# Altium integrated library Connector_Interface.IntLib: 49 symbols
Pins are listed as number, name and electrical type; pins without a type are passive.

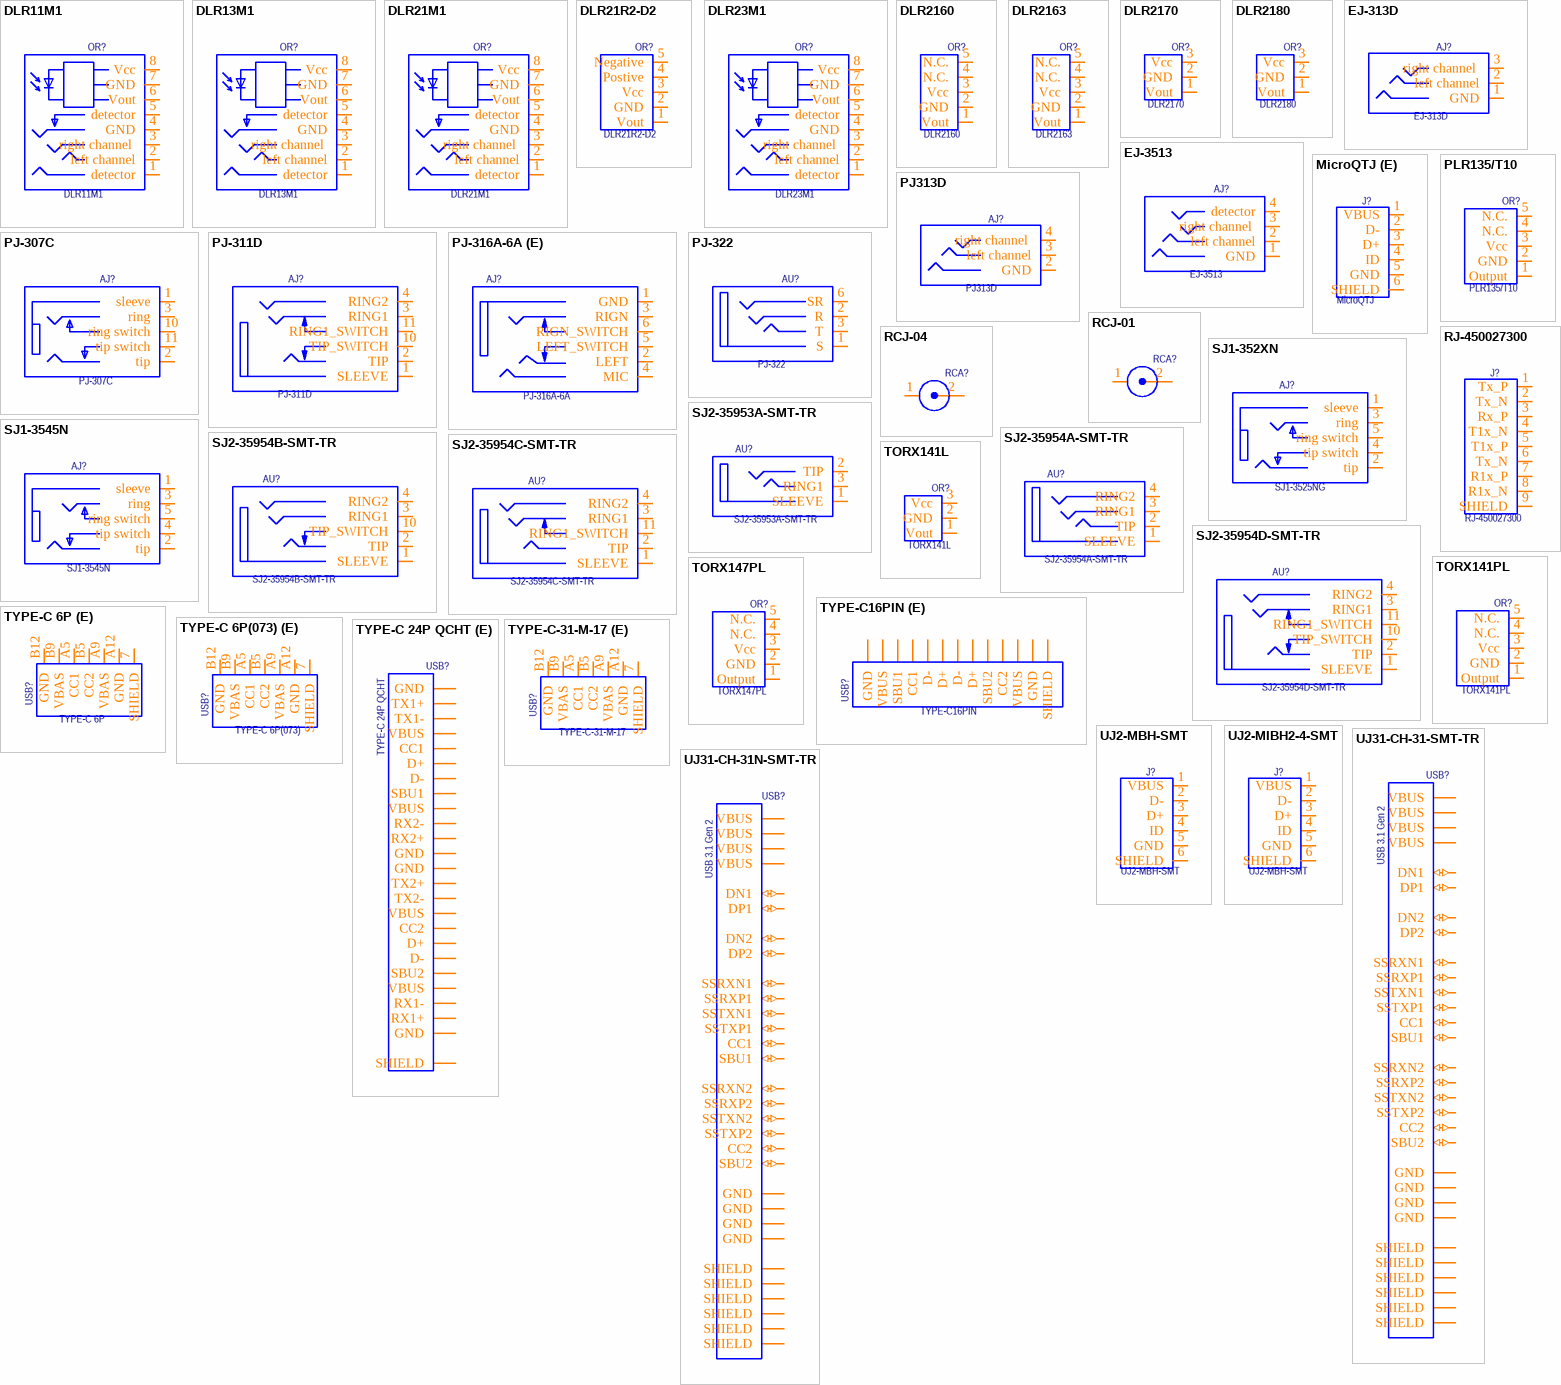
[diagram p0: symbols DLR11M1 to UJ31-CH-31N-SMT-TR]

## DLR11M1
designator OR?  value DLR11M1  (hidden comment: *)
FIBER OPTIC DATA LINK; Manufacturer: Aixin Opto-Electrical Techn; Manufacturer PartNumber: DLR11M1_16Mbps_SPEC_087; Note: Receivers; Temp.Characteristic: -20C to +70C; Voltage: 2.7-5.5 V; HelpURL: http://www.axpof.com/Article/download/aid/10395/fn/DLR11M1_16Mbps_SPEC_087.pdf.html; Publisher: Catcatcat Electronics; Website developer: http://catcatcat.d-lan.dp.ua/; Manufacturer URL: http://www.toslink.cn/Index/index.html; Assembly type: Manual Part
footprint DLR21M1 smd (FIBER OPTIC RECEIVING MODULE)
pins: 1 detector, 2 left channel, 3 right channel , 4 GND, 5 detector, 6 Vout, 7 GND, 8 Vcc

## DLR13M1
designator OR?  value DLR13M1  (hidden comment: *)
FIBER OPTIC DATA LINK; Manufacturer: Aixin Opto-Electrical Techn; Manufacturer PartNumber: DLR13M1_16Mbps_SPEC_084; Note: Receivers; Temp.Characteristic: -20C to +70C; Voltage: 2.7-5.5 V; HelpURL: http://www.axpof.com/Article/download/aid/10370/fn/DLR13M1_16Mbps_SPEC_084.pdf.html; Publisher: Catcatcat Electronics; Website developer: http://catcatcat.d-lan.dp.ua/; Manufacturer URL: http://www.toslink.cn/Index/index.html; Assembly type: Manual Part
footprint DLR23M1 (FIBER OPTIC RECEIVING MODULE)
pins: 1 detector, 2 left channel, 3 right channel , 4 GND, 5 detector, 6 Vout, 7 GND, 8 Vcc

## DLR21M1
designator OR?  value DLR21M1  (hidden comment: *)
FIBER OPTIC DATA LINK; Manufacturer: Aixin Opto-Electrical Techn; Manufacturer PartNumber: DLR21M1_25Mbps_SPEC_170; Note: Receivers; Temp.Characteristic: -20C to +70C; Voltage: 2.7-5.5 V; HelpURL: http://www.axpof.com/Article/download/aid/10396/fn/DLR21M1_25Mbps_SPEC_170.pdf.html; Publisher: Catcatcat Electronics; Website developer: http://catcatcat.d-lan.dp.ua/; Manufacturer URL: http://www.toslink.cn/Index/index.html; Assembly type: Manual Part
footprint DLR21M1 smd (FIBER OPTIC RECEIVING MODULE)
pins: 1 detector, 2 left channel, 3 right channel , 4 GND, 5 detector, 6 Vout, 7 GND, 8 Vcc

## DLR21R2-D2
designator OR?  value DLR21R2-D2  (hidden comment: *)
Fibre Optic Transmitters, Receivers, Transceivers TOSLINK RECEIVER Brd mount 25Mbps; Manufacturer: Aixin Opto-Electrical Techn; Manufacturer PartNumber: DLR21R2-D2_25Mbps_SPEC_103; Temp.Characteristic: -20C to +70C; Voltage: 2.7-5.5 V; HelpURL: http://www.axpof.com/Article/download/aid/10392/fn/DLR21R2-D2_25Mbps_SPEC_103.pdf.html; Note: Receivers; Publisher: Catcatcat Electronics; Website developer: http://catcatcat.d-lan.dp.ua/; Manufacturer URL: http://www.toslink.cn/Index/index.html; Assembly type: Manual Part
footprint DLR21R2-D2 (FIBER OPTIC RECEIVING MODULE)
pins: 1 Vout, 2 GND, 3 Vcc, 4 Postive, 5 Negative

## DLR23M1
designator OR?  value DLR23M1  (hidden comment: *)
FIBER OPTIC DATA LINK; Manufacturer: Aixin Opto-Electrical Techn; Manufacturer PartNumber: DLR23M1_25Mbps_SPEC; Note: Receivers; Temp.Characteristic: -20C to +70C; Voltage: 2.7-5.5 V; HelpURL: http://www.axpof.com/Article/download/aid/10375/fn/DLR23M1_25Mbps_SPEC.pdf.html; Publisher: Catcatcat Electronics; Website developer: http://catcatcat.d-lan.dp.ua/; Manufacturer URL: http://www.toslink.cn/Index/index.html; Assembly type: Manual Part
footprint DLR23M1 (FIBER OPTIC RECEIVING MODULE)
pins: 1 detector, 2 left channel, 3 right channel , 4 GND, 5 detector, 6 Vout, 7 GND, 8 Vcc

## DLR2160
designator OR?  value DLR2160  (hidden comment: *)
Fibre Optic Transmitters, Receivers, Transceivers TOSLINK RECEIVER Brd mount 25Mbps; Manufacturer: Aixin Opto-Electrical Techn; Manufacturer PartNumber: DLR2160_25Mbps_SPEC_156; Temp.Characteristic: -20C to +70C; Voltage: 2.7-5.5 V; HelpURL: http://www.axpof.com/Article/download/aid/10330/fn/DLR2160_25Mbps_SPEC_156.pdf.html; Note: Receivers; Publisher: Catcatcat Electronics; Website developer: http://catcatcat.d-lan.dp.ua/; Manufacturer URL: http://www.toslink.cn/Index/index.html; Assembly type: Manual Part
footprint DLR2160 (FIBER OPTIC RECEIVING MODULE)
pins: 1 Vout, 2 GND, 3 Vcc, 4 N.C., 5 N.C.

## DLR2163
designator OR?  value DLR2163  (hidden comment: *)
Fibre Optic Transmitters, Receivers, Transceivers TOSLINK RECEIVER Brd mount 25Mbps; Manufacturer: Aixin Opto-Electrical Techn; Manufacturer PartNumber: DLR2163_25Mbps_SPEC_256; Temp.Characteristic: -20C to +70C; Voltage: 2.7-5.5 V; HelpURL: http://www.axpof.com/Article/download/aid/10323/fn/DLR2163_25Mbps_SPEC_256.pdf.html; Note: Receivers; Publisher: Catcatcat Electronics; Website developer: http://catcatcat.d-lan.dp.ua/; Manufacturer URL: http://www.toslink.cn/Index/index.html; Assembly type: Manual Part
footprint DLR2163 (FIBER OPTIC RECEIVING MODULE)
pins: 1 Vout, 2 GND, 3 Vcc, 4 N.C., 5 N.C.

## DLR2170
designator OR?  value DLR2170  (hidden comment: *)
Fibre Optic Transmitters, Receivers, Transceivers TOSLINK RECEIVER Brd mount 25Mbps; Manufacturer: Aixin Opto-Electrical Techn; Manufacturer PartNumber: DLR2170_25Mbps_SPEC_160; Temp.Characteristic: -20C to +70C; Voltage: 2.7-5.5 V; HelpURL: http://www.axpof.com/Article/download/aid/10324/fn/DLR2170_25Mbps_SPEC_160.pdf.html; Note: Receivers; Publisher: Catcatcat Electronics; Website developer: http://catcatcat.d-lan.dp.ua/; Manufacturer URL: http://www.toslink.cn/Index/index.html; Assembly type: Manual Part
footprint DLR2170 (FIBER OPTIC RECEIVING MODULE)
pins: 1 Vout, 2 GND, 3 Vcc

## DLR2180
designator OR?  value DLR2180  (hidden comment: *)
Fibre Optic Transmitters, Receivers, Transceivers TOSLINK RECEIVER Brd mount 25Mbps; Manufacturer: Aixin Opto-Electrical Techn; Manufacturer PartNumber: DLR2180_25Mbps_SPEC_098; Temp.Characteristic: -20C to +70C; Voltage: 2.7-5.5 V; HelpURL: http://www.axpof.com/Article/download/aid/10325/fn/DLR2180_25Mbps_SPEC_098.pdf.html; Note: Receivers; Publisher: Catcatcat Electronics; Website developer: http://catcatcat.d-lan.dp.ua/; Manufacturer URL: http://www.toslink.cn/Index/index.html; Assembly type: Manual Part
footprint DLR2180 (FIBER OPTIC RECEIVING MODULE)
pins: 1 Vout, 2 GND, 3 Vcc

## EJ-313D
designator AJ?
AUDIO JACKS 3.5 MM; Manufacturer PartNumber: EJ-3513; Note: Connector Interface; Temp.Characteristic: -20C to +70C; Voltage: 2.7-5.5 V; Publisher: Catcatcat Electronics; Website developer: http://catcatcat.d-lan.dp.ua/; Assembly type: Manual Part; Value: EJ-313D
footprint EJ-313D
pins: 1 GND, 2 left channel, 3 right channel 

## EJ-3513
designator AJ?  value EJ-3513  (hidden comment: *)
AUDIO JACKS 3.5 MM; Note: Connector Interface; Temp.Characteristic: -20C to +70C; Voltage: 2.7-5.5 V; Publisher: Catcatcat Electronics; Manufacturer PartNumber: EJ-3513; Website developer: http://catcatcat.d-lan.dp.ua/; Assembly type: Manual Part
footprint EJ-3513
pins: 1 GND, 2 left channel, 3 right channel , 4 detector

## MicroQTJ (E)
designator J?, comment MicroQTJ
SMD USB Connectors RoHS; Manufacturer: we-online; Manufacturer PartNumber: SHOU HAN; Note: Connector Interface; Temp.Characteristic: -20C to +70C; HelpURL: https://datasheet.lcsc.com/szlcsc/1912111437_SHOU-HAN-MicroQTJ_C404968.pdf; Publisher: Catcatcat Electronics; Website developer: http://catcatcat.d-lan.dp.ua/; Detailed Description: SMD USB Connectors RoHS; Assembly type: Extended Part; Package / Case: SMD; PartNumber LCSC: C404968; Pricing LCSC: 0.0267; Value: MicroQTJ
footprint USB micro B 3 (USB micro B)
pins: 1 VBUS, 2 D-, 3 D+, 4 ID, 5 GND, 6 SHIELD

## PJ313D
designator AJ?
AUDIO JACKS 3.5 MM; Manufacturer: BOOMELE(Boom Precision Elec); Note: Audio Jack Connector; Temp.Characteristic: -20C to +70C; Voltage: 2.7-5.5 V; Detailed Description: 3.5mm 插件式耳机座 5 Female Horizontal Through Hole Audio & Video Connectors RoHS; HelpURL: https://datasheet.lcsc.com/szlcsc/1810271709_BOOMELE-Boom-Precision-Elec-C18167_C18167.pdf; Publisher: Catcatcat Electronics; Manufacturer PartNumber: PJ313D; Website developer: http://catcatcat.d-lan.dp.ua/; Assembly type: Manual Part; PartNumber LCSC: C18167; Pricing LCSC: 0.050716; Value: PJ313D
footprint PJ313D
pins: 2 GND, 3 left channel, 4 right channel 

## PJ-307C
designator AJ?
3.5 MM AUDIO JACKS стерео; Manufacturer: BOOMELE(Boom Precision Elec); Note: Audio & Video Connectors; Temp.Characteristic: -20C to +70C; Voltage: 2.7-5.5 V; HelpURL: https://www.cuidevices.com/product/resource/sj1-352xn.pdf; Publisher: Catcatcat Electronics; Manufacturer PartNumber: PJ-307C; Website developer: http://catcatcat.d-lan.dp.ua/; Assembly type: Manual Part; Dealer Аlternative: https://voron.ua/catalog/018788--gnezdo_pj3f07pj-307_35mm_stereo_otkl; PartNumber LCSC: C16684; Pricing LCSC: 0.028176; Value: PJ-307C
footprint SJ1-352XN (3.5 MM AUDIO JACKS)
pins: 1 sleeve, 2 tip, 3 ring, 10 ring switch, 11 tip switch

## PJ-311D
designator AJ?
AUDIO JACKS 3.5 MM; Note: Connector Interface; Temp.Characteristic: -20C to +70C; HelpURL: https://voron.ua/catalog/037846; Publisher: Catcatcat Electronics; Manufacturer PartNumber: PJ-311D; Website developer: http://catcatcat.d-lan.dp.ua/; Assembly type: Manual Part; Value: PJ-311D
footprint PJ-311D
footprint PJ-311D - no3D
pins: 1 SLEEVE, 2 TIP, 3 RING1, 4 RING2, 10 TIP_SWITCH, 11 RING1_SWITCH

## PJ-316A-6A (E)
designator AJ?, comment PJ-316A-6A
3.5mm SMD Headphone Holder 6 Female Horizontal SMD Audio & Video Connectors RoHS; Manufacturer: Korean Hroparts Elec; Note: Connector Interface; Temp.Characteristic: -20C to +70C; Sales Unit: For qty≤5,charges a fixed fee $0.8655; HelpURL: https://datasheet.lcsc.com/szlcsc/1810121710_Korean-Hroparts-Elec-PJ-316A-6A_C128987.pdf; Publisher: Catcatcat Electronics; Manufacturer PartNumber: PJ-316A-6A; Website developer: http://catcatcat.d-lan.dp.ua/; Detailed Description: 3.5mm SMD Headphone Holder 6 Female Horizontal SMD Audio & Video Connectors RoHS; Assembly type: Extended Part; Package / Case: SMD; PartNumber LCSC: C128987; Pricing LCSC: 0.1731; Value: PJ-316A-6A
footprint PJ-316A-6A
footprint PJ-316A-6A - no3D
pins: 1 GND, 2 LEFT, 3 RIGN, 4 MIC, 5 LEFT_SWITCH, 6 RIGN_SWITCH

## PJ-322
designator AU?
AUDIO JACKS 3.5 MM; Manufacturer PartNumber: EJ-3513; Note: Connector Interface; Temp.Characteristic: -20C to +70C; Voltage: 2.7-5.5 V; HelpURL: https://datasheet.octopart.com/FC68125-Cliff-datasheet-14704145.pdf; Publisher: Catcatcat Electronics; Website developer: http://catcatcat.d-lan.dp.ua/; Assembly type: Manual Part; Value: PJ-322
footprint PJ-322
pins: 1 S, 2 R, 3 T, 6 SR

## PLR135/T10
designator OR?
RECEIVER FIBER OPT IR PHOTOLINK; Manufacturer: Everlight Electronics Co Ltd; Note: Fiber Optics - Receivers; Temp.Characteristic: -20C to +70C; Voltage: 2.4V ~ 5.5V; Detailed Description: Fiber Optic Receiver General Data Transfer 16Mbps -27dBm 2.4V ~ 5.5V 12mA; Data Rate: 16Mbps; HelpURL: http://www.everlight.com/file/ProductFile/PLR135-T10.pdf; Dealer: https://ru.aliexpress.com/item/PLR135-T10-PLR135-10/32923100244.html?spm=a2g0s.9042311.0.0.3da233ed3KjIXT; Publisher: Catcatcat Electronics; Manufacturer PartNumber: PLR135/T10; Website developer: http://catcatcat.d-lan.dp.ua/; Manufacturer URL: http://www.everlight.com/; Assembly type: Manual Part; Value: PLR135/T10
footprint TORX147PL (FIBER OPTIC RECEIVING MODULE)
pins: 1 Output, 2 GND, 3 Vcc, 4 N.C., 5 N.C.

## RCJ-01
designator RCA?  (value not drawn)
RCA Jack Connector; Manufacturer: cui; Manufacturer PartNumber: RCJ-01; Note: Connector Interface; Temp.Characteristic: -40C to +85C; Value: {Value}; HelpURL: https://www.cui.com/product/resource/pdf/rcj-01x.pdf; Publisher: Catcatcat Electronics; Website developer: http://catcatcat.d-lan.dp.ua/; Manufacturer URL: https://www.cui.com/; Assembly type: Manual Part
footprint RCJ-011 black (RCA Jack Connector)
footprint RCJ-012 red (RCA Jack Connector)
footprint RCJ-013 while (RCA Jack Connector)
footprint RCJ-014 yellow (RCA Jack Connector)
footprint RCJ-015 blue (RCA Jack Connector)
footprint RCJ-016 green (RCA Jack Connector)
footprint RCJ-017 orange (RCA Jack Connector)
pins: 1, 2

## RCJ-04
designator RCA?  (value not drawn)
RCA Jack Connector; Manufacturer: cui; Manufacturer PartNumber: RCJ-04; Note: Connector Interface; Temp.Characteristic: -40C to +85C; Value: {Value}; HelpURL: https://www.cui.com/product/resource/pdf/rcj-04x.pdf; Publisher: Catcatcat Electronics; Website developer: http://catcatcat.d-lan.dp.ua/; Manufacturer URL: https://www.cui.com/; Assembly type: Manual Part
footprint RCJ-041 black (RCA Jack Connector)
footprint RCJ-042 red (RCA Jack Connector)
footprint RCJ-043 while (RCA Jack Connector)
footprint RCJ-044 yellow (RCA Jack Connector)
footprint RCJ-045 blue (RCA Jack Connector)
footprint RCJ-046 green (RCA Jack Connector)
footprint RCJ-047 orange (RCA Jack Connector)
pins: 1, 2

## RJ-450027300
designator J?
Разъем RJ-45, без светодиодов, экранированный; Manufacturer: ATOM; Manufacturer PartNumber: ATOM-A01152; Temp.Characteristic: -20C to +70C; Detailed Description: Разъем RJ-45 монтаж на плату, без светодиодов, экранированный; HelpURL: http://microchip.ua/atom/RJ-450027300.pdf; Note: RJ-45; Publisher: Catcatcat Electronics; Website developer: http://catcatcat.d-lan.dp.ua/; Assembly type: Manual Part; Dealer Аlternative: http://www.microchip.ua/; Value: RJ-450027300
footprint RJ-450027300
pins: 1 Tx_P, 2 Tx_N, 3 Rx_P, 4 T1x_N, 5 T1x_P, 6 Tx_N, 7 R1x_P, 8 R1x_N, 9 SHIELD

## SJ1-352XN
designator AJ?  value SJ1-3525NG  (hidden comment: *)
AUDIO JACKS 3.5 MM; Note: Connector Interface; Temp.Characteristic: -20C to +70C; Voltage: 2.7-5.5 V; HelpURL: https://www.cuidevices.com/product/resource/sj1-352xn.pdf; Publisher: Catcatcat Electronics; Website developer: http://catcatcat.d-lan.dp.ua/; Assembly type: Manual Part
footprint SJ1-352XNG (3.5 MM AUDIO JACKS)
pins: 1 sleeve, 2 tip, 3 ring, 4 tip switch, 5 ring switch

## SJ1-3545N
designator AJ?
AUDIO JACKS 3.5 MM; Note: Connector Interface; Temp.Characteristic: -20C to +70C; Voltage: 2.7-5.5 V; HelpURL: https://www.cuidevices.com/product/resource/sj1-354xn-series.pdf; Publisher: Catcatcat Electronics; Website developer: http://catcatcat.d-lan.dp.ua/; Assembly type: Manual Part; Value: SJ1-3545N
footprint SJ1-3545N
pins: 1 sleeve, 2 tip, 3 ring, 4 tip switch, 5 ring switch

## SJ2-35953A-SMT-TR
designator AU?
AUDIO JACKS 3.5 MM; Note: Connector Interface; Temp.Characteristic: -20C to +70C; Voltage: 2.7-5.5 V; HelpURL: https://www.cuidevices.com/product/resource/sj2-3595x-smt.pdf; Publisher: Catcatcat Electronics; Manufacturer PartNumber: SJ2-35953A-SMT-TR; Website developer: http://catcatcat.d-lan.dp.ua/; Assembly type: Manual Part; Value: SJ2-35953A-SMT-TR
footprint CUI_SJ2-35953A-SMT-TR
pins: 1 SLEEVE, 2 TIP, 3 RING1

## SJ2-35954A-SMT-TR
designator AU?
AUDIO JACKS 3.5 MM; Note: Connector Interface; Temp.Characteristic: -20C to +70C; Voltage: 2.7-5.5 V; HelpURL: https://www.cuidevices.com/product/resource/sj2-3595x-smt.pdf; Publisher: Catcatcat Electronics; Manufacturer PartNumber: SJ2-35954A-SMT-TR; Website developer: http://catcatcat.d-lan.dp.ua/; Assembly type: Manual Part; Value: SJ2-35954A-SMT-TR
footprint CUI_SJ2-35954A-SMT-TR
pins: 1 SLEEVE, 2 TIP, 3 RING1, 4 RING2

## SJ2-35954B-SMT-TR
designator AU?
AUDIO JACKS 3.5 MM; Note: Connector Interface; Temp.Characteristic: -20C to +70C; Voltage: 2.7-5.5 V; HelpURL: https://www.cuidevices.com/product/resource/sj2-3595x-smt.pdf; Publisher: Catcatcat Electronics; Manufacturer PartNumber: SJ2-35954B-SMT-TR; Website developer: http://catcatcat.d-lan.dp.ua/; Assembly type: Manual Part; Value: SJ2-35954B-SMT-TR
footprint CUI_SJ2-35954B-SMT-TR
pins: 1 SLEEVE, 2 TIP, 3 RING1, 4 RING2, 10 TIP_SWITCH

## SJ2-35954C-SMT-TR
designator AU?
AUDIO JACKS 3.5 MM; Note: Connector Interface; Temp.Characteristic: -20C to +70C; Voltage: 2.7-5.5 V; HelpURL: https://www.cuidevices.com/product/resource/sj2-3595x-smt.pdf; Publisher: Catcatcat Electronics; Manufacturer PartNumber: SJ2-35954C-SMT-TR; Website developer: http://catcatcat.d-lan.dp.ua/; Assembly type: Manual Part; Value: SJ2-35954C-SMT-TR
footprint CUI_SJ2-35954C-SMT-TR
pins: 1 SLEEVE, 2 TIP, 3 RING1, 4 RING2, 11 RING1_SWITCH

## SJ2-35954D-SMT-TR
designator AU?
AUDIO JACKS 3.5 MM; Note: Connector Interface; Temp.Characteristic: -20C to +70C; Voltage: 2.7-5.5 V; HelpURL: https://www.cuidevices.com/product/resource/sj2-3595x-smt.pdf; Publisher: Catcatcat Electronics; Manufacturer PartNumber: SJ2-35954D-SMT-TR; Website developer: http://catcatcat.d-lan.dp.ua/; Assembly type: Manual Part; Value: SJ2-35954D-SMT-TR
footprint CUI_SJ2-35954D-SMT-TR
pins: 1 SLEEVE, 2 TIP, 3 RING1, 4 RING2, 10 TIP_SWITCH, 11 RING1_SWITCH

## TORX141L
designator OR?  value TORX141L  (hidden comment: *)
FIBER OPTIC RECEIVING MODULE; Note: Receivers; Temp.Characteristic: -20C to +70C; Voltage: 2.7-5.5 V; Publisher: Catcatcat Electronics; Website developer: http://catcatcat.d-lan.dp.ua/; Assembly type: Manual Part
footprint DLR2180 (FIBER OPTIC RECEIVING MODULE)
pins: 1 Vout, 2 GND, 3 Vcc

## TORX141PL
designator OR?  value TORX141PL  (hidden comment: *)
Fibre Optic Transmitters, Receivers, Transceivers TOSLINK RECEIVER Brd mount 25Mbps; Manufacturer: Toshiba; Temp.Characteristic: -20C to +70C; Voltage: 3 V; HelpURL: https://eu.mouser.com/datasheet/2/408/torx147pl(f,t)_en_datasheet_061228-1209275.pdf; Note: Receivers; Publisher: Catcatcat Electronics; Manufacturer PartNumber: TORX141PL; Website developer: http://catcatcat.d-lan.dp.ua/; Assembly type: Manual Part
footprint TORX147PL (FIBER OPTIC RECEIVING MODULE)
pins: 1 Output, 2 GND, 3 Vcc, 4 N.C., 5 N.C.

## TORX147PL
designator OR?  value TORX147PL  (hidden comment: *)
Fibre Optic Transmitters, Receivers, Transceivers TOSLINK RECEIVER Brd mount 25Mbps; Manufacturer: Toshiba; Manufacturer PartNumber: TORX147PL(25M,F,T); Temp.Characteristic: -20C to +70C; Voltage: 3 V; HelpURL: https://eu.mouser.com/datasheet/2/408/torx147pl(f,t)_en_datasheet_061228-1209275.pdf; Note: Receivers; Publisher: Catcatcat Electronics; Website developer: http://catcatcat.d-lan.dp.ua/; Assembly type: Manual Part
footprint TORX147PL (FIBER OPTIC RECEIVING MODULE)
pins: 1 Output, 2 GND, 3 Vcc, 4 N.C., 5 N.C.

## TYPE-C16PIN (E)
designator USB?, comment TYPE-C16PIN
Type C DIP+SMD USB Connectors RoHS; Manufacturer: SHOU HAN; Temp.Characteristic: -20C to +70C; Sales Unit: For qty≤5,charges a fixed fee $0.5630; HelpURL: https://datasheet.lcsc.com/szlcsc/1912111437_SHOU-HAN-TYPE-C16PIN_C393939.pdf; Note: DIP+SMD USB Connectors RoHS; Publisher: Catcatcat Electronics; Manufacturer PartNumber: TYPE-C16PIN; Website developer: http://catcatcat.d-lan.dp.ua/; Manufacturer URL: https://www.cuidevices.com/catalog/interconnect/connectors/usb-connectors; Detailed Description: SMD USB Connectors RoHS; Assembly type: Extended Part; Package / Case: SMD; PartNumber LCSC: C393939; Pricing LCSC: 0.1126; Value: TYPE-C16PIN
footprint TYPE-C16PIN
pins: A1B12 GND (power), A4B9 VBUS (power), A5 CC1, A6 D+, A7 D-, A8 SBU1, B1A12 GND, B4A9 VBUS, B5 CC2, B6 D+, B7 D-, B8 SBU2, SH SHIELD (power)

## TYPE-C 6P (E)
designator USB?, comment TYPE-C 6P
5A 20V USB Connectors RoHS; Manufacturer: SHOU HAN; Temp.Characteristic: -20C to +70C; Voltage: 20V 5A; Detailed Description: 5 A USB Connectors RoHS; HelpURL: https://datasheet.lcsc.com/szlcsc/2012031006_SHOU-HAN-TYPE-C-6P_C456012.pdf; Note: USB Connectors RoHS; Publisher: Catcatcat Electronics; Manufacturer PartNumber: TYPE-C 6P; Website developer: http://catcatcat.d-lan.dp.ua/; Assembly type: Extended Part; Package / Case: USB - Type C; PartNumber LCSC: C456012; Pricing LCSC: 0.0605; Value: TYPE-C 6P
footprint TYPE-C 6P(073)
pins: 7 SHIELD, A5 CC1, A9 VBAS, A12 GND, B5 CC2, B9 VBAS, B12 GND

## TYPE-C 6P(073) (E)
designator USB?, comment TYPE-C 6P(073)
5A 5V USB Connectors RoHS; Manufacturer: SHOU HAN; Temp.Characteristic: -20C to +70C; Voltage: 5V 5A; Detailed Description: 5 A USB Connectors RoHS; HelpURL: https://datasheet.lcsc.com/szlcsc/2006181823_SHOU-HAN-TYPE-C-6P-073_C668623.pdf; Note: USB Connectors RoHS; Publisher: Catcatcat Electronics; Manufacturer PartNumber: TYPE-C 6P(073); Website developer: http://catcatcat.d-lan.dp.ua/; Assembly type: Extended Part; Package / Case: USB - Type C; PartNumber LCSC: C668623; Pricing LCSC: 0.0581; Value: TYPE-C 6P(073)
footprint TYPE-C 6P(073)
pins: 7 SHIELD, A5 CC1, A9 VBAS, A12 GND, B5 CC2, B9 VBAS, B12 GND

## TYPE-C 24P QCHT (E)
designator USB?, comment TYPE-C 24P QCHT
Type C DIP+SMD USB Connectors RoHS; Manufacturer: SHOU HAN; Temp.Characteristic: -20C to +70C; Sales Unit: For qty≤2,charges a fixed fee $0.9880; HelpURL: https://datasheet.lcsc.com/szlcsc/1912111437_SHOU-HAN-TYPE-C-24P-QCHT_C456013.pdf; Note: DIP+SMD USB Connectors RoHS; Publisher: Catcatcat Electronics; Manufacturer PartNumber: TYPE-C 24P QCHT; Website developer: http://catcatcat.d-lan.dp.ua/; Manufacturer URL: https://www.cuidevices.com/catalog/interconnect/connectors/usb-connectors; Detailed Description: DIP+SMD USB Connectors RoHS; Assembly type: Extended Part; Package / Case: DIP+SMD; PartNumber LCSC: C456013; Pricing LCSC: 0.4940; Value: TYPE-C 24P QCHT
footprint TYPE-C 24P QCHT
pins: A1 GND (power), A2 TX1+ (power), A3 TX1- (power), A4 VBUS (power), A5 CC1, A6 D+, A7 D-, A8 SBU1, A9 VBUS, A10 RX2-, A11 RX2+, A12 GND, B1 GND, B2 TX2+, B3 TX2-, B4 VBUS, B5 CC2, B6 D+, B7 D-, B8 SBU2, B9 VBUS (power), B10 RX1- (power), B11 RX1+ (power), B12 GND (power), SH SHIELD (power)

## TYPE-C-31-M-17 (E)
designator USB?, comment TYPE-C-31-M-17
USB Connectors RoHS; Manufacturer: Korean Hroparts Elec; Temp.Characteristic: -20C to +70C; Voltage: 3 V; HelpURL: https://datasheet.lcsc.com/szlcsc/1811101526_Korean-Hroparts-Elec-TYPE-C-31-M-17_C283540.pdf; Note: USB Connectors RoHS; Publisher: Catcatcat Electronics; Manufacturer PartNumber: TYPE-C-31-M-17; Website developer: http://catcatcat.d-lan.dp.ua/; Detailed Description: USB Connectors RoHS; Assembly type: Manual Part; Package / Case: USB - Type C; PartNumber LCSC: C283540; Pricing LCSC: 0.2045; Value: TYPE-C-31-M-17
footprint TYPE-C-31-M-17
pins: 7 SHIELD, A5 CC1, A9 VBAS, A12 GND, B5 CC2, B9 VBAS, B12 GND

## UJ2-MBH-SMT
designator J?
USB mini B; Note: Receivers; Temp.Characteristic: -20C to +70C; Voltage: 3 V; Publisher: Catcatcat Electronics; Manufacturer PartNumber: UJ2-MBH-SMT; Website developer: http://catcatcat.d-lan.dp.ua/; Assembly type: Manual Part; Value: UJ2-MBH-SMT
footprint USB mini B
footprint UJ2-MBH-SMT (USB mini B)
pins: 1 VBUS, 2 D-, 3 D+, 4 ID, 5 GND, 6 SHIELD

## UJ2-MIBH2-4-SMT
designator J?, comment UJ2-MBH-SMT
USB mini B; Note: Receivers; Temp.Characteristic: -20C to +70C; Voltage: 3 V; Publisher: Catcatcat Electronics; Manufacturer PartNumber: UJ2-MBH-SMT; Website developer: http://catcatcat.d-lan.dp.ua/; Assembly type: Manual Part; Value: UJ2-MBH-SMT
footprint UJ2-MIBH2-4-SMT
pins: 1 VBUS, 2 D-, 3 D+, 4 ID, 5 GND, 6 SHIELD

## UJ31-CH-31-SMT-TR
designator USB?  value USB 3.1 Gen 2  (hidden comment: UJ31-CH-31-SMT-TR)
Type C; Manufacturer: we-online; Temp.Characteristic: -20C to +70C; HelpURL: https://www.cuidevices.com/product/resource/pdf/uj31-ch-smt.pdf; Note: USB 3.1 Gen 2; Publisher: Catcatcat Electronics; Manufacturer PartNumber: UJ31-CH-31-SMT-TR; Website developer: http://catcatcat.d-lan.dp.ua/; Manufacturer URL: https://www.cuidevices.com/catalog/interconnect/connectors/usb-connectors; Detailed Description: Type C; Assembly type: Manual Part; Package / Case: Surface Mount
footprint UJ31-CH-31-SMT-TR
pins: A1 GND (power), A2 SSTXP1 (io), A3 SSTXN1 (io), A4 VBUS (power), A5 CC1 (io), A6 DP1 (io), A7 DN1 (io), A8 SBU1 (io), A9 VBUS (power), A10 SSRXN2 (io), A11 SSRXP2 (io), A12 GND (power), B1 GND (power), B2 SSTXP2 (io), B3 SSTXN2 (io), B4 VBUS (power), B5 CC2 (io), B6 DP2 (io), B7 DN2 (io), B8 SBU2 (io), B9 VBUS (power), B10 SSRXN1 (io), B11 SSRXP1 (io), B12 GND (power), SH1 SHIELD (power), SH2 SHIELD (power), SH3 SHIELD (power), SH4 SHIELD (power), SH5 SHIELD (power), SH6 SHIELD (power)

## UJ31-CH-31N-SMT-TR
designator USB?  value USB 3.1 Gen 2  (hidden comment: UJ31-CH-31N-SMT-TR)
Type C; Manufacturer: we-online; Manufacturer PartNumber: UJ31-CH-31-SMT-TR; Temp.Characteristic: -20C to +70C; HelpURL: https://www.cuidevices.com/product/resource/pdf/uj31-ch-smt.pdf; Note: USB 3.1 Gen 2; Publisher: Catcatcat Electronics; Website developer: http://catcatcat.d-lan.dp.ua/; Manufacturer URL: https://www.cuidevices.com/catalog/interconnect/connectors/usb-connectors; Detailed Description: Type C; Assembly type: Manual Part; Package / Case: Surface Mount
footprint UJ31-CH-31N-SMT-TR
pins: A1 GND (power), A2 SSTXP1 (io), A3 SSTXN1 (io), A4 VBUS (power), A5 CC1 (io), A6 DP1 (io), A7 DN1 (io), A8 SBU1 (io), A9 VBUS (power), A10 SSRXN2 (io), A11 SSRXP2 (io), A12 GND (power), B1 GND (power), B2 SSTXP2 (io), B3 SSTXN2 (io), B4 VBUS (power), B5 CC2 (io), B6 DP2 (io), B7 DN2 (io), B8 SBU2 (io), B9 VBUS (power), B10 SSRXN1 (io), B11 SSRXP1 (io), B12 GND (power), SH1 SHIELD (power), SH2 SHIELD (power), SH3 SHIELD (power), SH4 SHIELD (power), SH5 SHIELD (power), SH6 SHIELD (power)

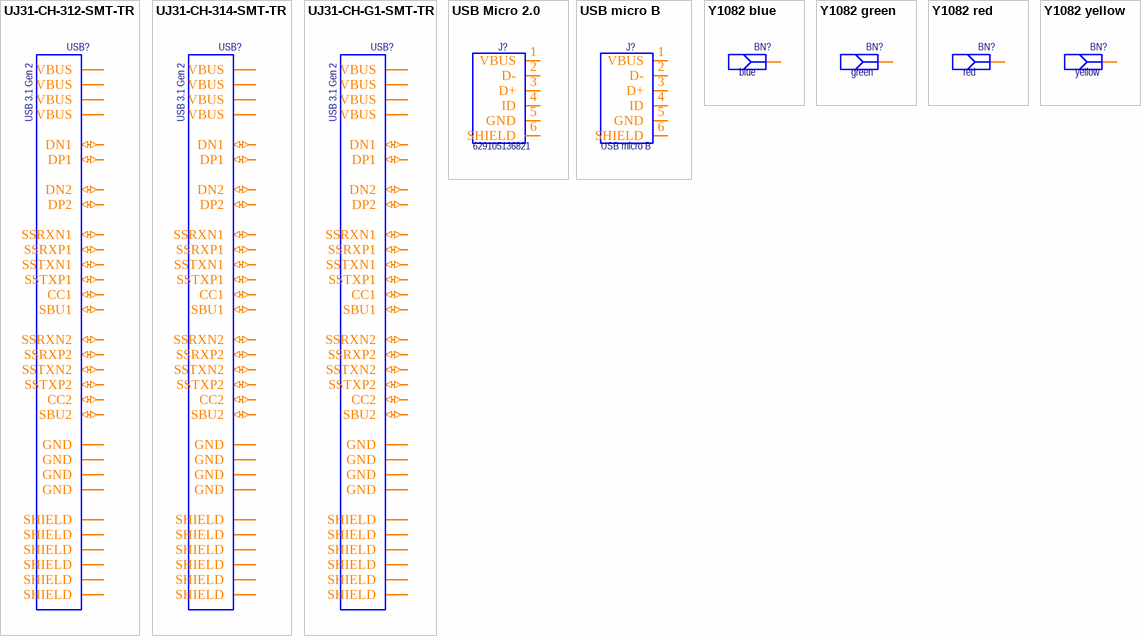
[diagram p1: symbols UJ31-CH-312-SMT-TR to Y1082 yellow]

## UJ31-CH-312-SMT-TR
designator USB?  value USB 3.1 Gen 2  (hidden comment: UJ31-CH-312-SMT-TR)
Type C; Manufacturer: we-online; Manufacturer PartNumber: UJ31-CH-31-SMT-TR; Temp.Characteristic: -20C to +70C; HelpURL: https://www.cuidevices.com/product/resource/pdf/uj31-ch-smt.pdf; Note: USB 3.1 Gen 2; Publisher: Catcatcat Electronics; Website developer: http://catcatcat.d-lan.dp.ua/; Manufacturer URL: https://www.cuidevices.com/catalog/interconnect/connectors/usb-connectors; Detailed Description: Type C; Assembly type: Manual Part; Package / Case: Surface Mount
footprint UJ31-CH-312-SMT-TR
pins: A1 GND (power), A2 SSTXP1 (io), A3 SSTXN1 (io), A4 VBUS (power), A5 CC1 (io), A6 DP1 (io), A7 DN1 (io), A8 SBU1 (io), A9 VBUS (power), A10 SSRXN2 (io), A11 SSRXP2 (io), A12 GND (power), B1 GND (power), B2 SSTXP2 (io), B3 SSTXN2 (io), B4 VBUS (power), B5 CC2 (io), B6 DP2 (io), B7 DN2 (io), B8 SBU2 (io), B9 VBUS (power), B10 SSRXN1 (io), B11 SSRXP1 (io), B12 GND (power), SH1 SHIELD (power), SH2 SHIELD (power), SH3 SHIELD (power), SH4 SHIELD (power), SH5 SHIELD (power), SH6 SHIELD (power)

## UJ31-CH-314-SMT-TR
designator USB?  value USB 3.1 Gen 2  (hidden comment: UJ31-CH-314-SMT-TR)
Type C; Manufacturer: we-online; Manufacturer PartNumber: UJ31-CH-31-SMT-TR; Temp.Characteristic: -20C to +70C; HelpURL: https://www.cuidevices.com/product/resource/pdf/uj31-ch-smt.pdf; Note: USB 3.1 Gen 2; Publisher: Catcatcat Electronics; Website developer: http://catcatcat.d-lan.dp.ua/; Manufacturer URL: https://www.cuidevices.com/catalog/interconnect/connectors/usb-connectors; Detailed Description: Type C; Assembly type: Manual Part; Package / Case: Surface Mount
footprint UJ31-CH-314-SMT-TR
pins: A1 GND (power), A2 SSTXP1 (io), A3 SSTXN1 (io), A4 VBUS (power), A5 CC1 (io), A6 DP1 (io), A7 DN1 (io), A8 SBU1 (io), A9 VBUS (power), A10 SSRXN2 (io), A11 SSRXP2 (io), A12 GND (power), B1 GND (power), B2 SSTXP2 (io), B3 SSTXN2 (io), B4 VBUS (power), B5 CC2 (io), B6 DP2 (io), B7 DN2 (io), B8 SBU2 (io), B9 VBUS (power), B10 SSRXN1 (io), B11 SSRXP1 (io), B12 GND (power), SH1 SHIELD (power), SH2 SHIELD (power), SH3 SHIELD (power), SH4 SHIELD (power), SH5 SHIELD (power), SH6 SHIELD (power)

## UJ31-CH-G1-SMT-TR
designator USB?  value USB 3.1 Gen 2  (hidden comment: UJ31-CH-G1-SMT-TR)
Type C; Manufacturer: we-online; Manufacturer PartNumber: UJ31-CH-31-SMT-TR; Temp.Characteristic: -20C to +70C; HelpURL: https://www.cuidevices.com/product/resource/uj31-ch-g1-smt-tr.pdf; Note: USB 3.1 Gen 2; Publisher: Catcatcat Electronics; Website developer: http://catcatcat.d-lan.dp.ua/; Manufacturer URL: https://www.cuidevices.com/catalog/interconnect/connectors/usb-connectors; Detailed Description: Type C; Assembly type: Manual Part; Package / Case: Surface Mount
footprint UJ31-CH-G1-SMT-TR
pins: A1 GND (power), A2 SSTXP1 (io), A3 SSTXN1 (io), A4 VBUS (power), A5 CC1 (io), A6 DP1 (io), A7 DN1 (io), A8 SBU1 (io), A9 VBUS (power), A10 SSRXN2 (io), A11 SSRXP2 (io), A12 GND (power), B1 GND (power), B2 SSTXP2 (io), B3 SSTXN2 (io), B4 VBUS (power), B5 CC2 (io), B6 DP2 (io), B7 DN2 (io), B8 SBU2 (io), B9 VBUS (power), B10 SSRXN1 (io), B11 SSRXP1 (io), B12 GND (power), SH1 SHIELD (power), SH2 SHIELD (power), SH3 SHIELD (power), SH4 SHIELD (power), SH5 SHIELD (power), SH6 SHIELD (power)

## USB Micro 2.0
designator J?, comment value 629105136821  (hidden comment: USB micro B)
WR-COM Micro USB 2.0 Horizontal 5 Contacts SMT; Manufacturer: we-online; Note: Connector Interface; Temp.Characteristic: -20C to +70C; HelpURL: https://katalog.we-online.de/em/datasheet/629105136821.pdf; Publisher: Catcatcat Electronics; Manufacturer PartNumber: 629105136821; Website developer: http://catcatcat.d-lan.dp.ua/; Manufacturer URL: https://katalog.we-online.de/de/em/COM_MICRO_SMT_TYPE_B_HORIZONTAL; Assembly type: Manual Part
footprint USB micro B 3 (USB micro B)
pins: 1 VBUS, 2 D-, 3 D+, 4 ID, 5 GND, 6 SHIELD

## USB micro B
designator J?
Note: Receivers; Temp.Characteristic: -20C to +70C; Voltage: 3 V; Publisher: Catcatcat Electronics; Website developer: http://catcatcat.d-lan.dp.ua/; Assembly type: Manual Part; Value: USB micro B
footprint USB micro B
footprint USB micro B 2 (USB micro B)
footprint USB micro B 3 (USB micro B)
footprint USB micro B 4 (USB micro B)
footprint USB micro B 5 (USB micro B)
footprint USB micro B 6 (USB micro B)
footprint USB micro B 3 voron (USB micro B)
pins: 1 VBUS, 2 D-, 3 D+, 4 ID, 5 GND, 6 SHIELD

## Y1082 blue
designator BN?, comment value blue  (hidden comment: Y1082)
blue; Note: Connector Interface; Temp.Characteristic: -20C to +70C; Voltage: 2.7-5.5 V; Publisher: Catcatcat Electronics; Manufacturer PartNumber: Y1082; Website developer: http://catcatcat.d-lan.dp.ua/; Assembly type: Manual Part
footprint Y1082 blue (banana)
footprint Y1082no3D (banana)
pins: 1 IN

## Y1082 green
designator BN?, comment value green  (hidden comment: Y1082)
green; Note: Connector Interface; Temp.Characteristic: -20C to +70C; Voltage: 2.7-5.5 V; Publisher: Catcatcat Electronics; Manufacturer PartNumber: Y1082; Website developer: http://catcatcat.d-lan.dp.ua/; Assembly type: Manual Part
footprint Y1082 blue (banana)
footprint Y1082no3D (banana)
pins: 1 IN

## Y1082 red
designator BN?, comment value red  (hidden comment: Y1082)
red; Note: Connector Interface; Temp.Characteristic: -20C to +70C; Voltage: 2.7-5.5 V; Publisher: Catcatcat Electronics; Manufacturer PartNumber: Y1082; Website developer: http://catcatcat.d-lan.dp.ua/; Assembly type: Manual Part
footprint Y1082 blue (banana)
footprint Y1082no3D (banana)
pins: 1 IN

## Y1082 yellow
designator BN?, comment value yellow  (hidden comment: Y1082)
yellow; Note: Connector Interface; Temp.Characteristic: -20C to +70C; Voltage: 2.7-5.5 V; Publisher: Catcatcat Electronics; Manufacturer PartNumber: Y1082; Website developer: http://catcatcat.d-lan.dp.ua/; Assembly type: Manual Part
footprint Y1082 red (banana)
footprint Y1082no3D (banana)
pins: 1 IN